# Altium footprint library PCBKU.PcbLib: 192 footprints (part 3 of 12)
Each footprint in its own frame and in the unit in brackets; x right, y up, seen from the top. Pads: shape width x height; smd on the part's side, far side on the other; paste and mask are expansions set on the pad; w line width, h text height; cw(c..) or ccw(c..) is an arc to the next point about the centre after c.
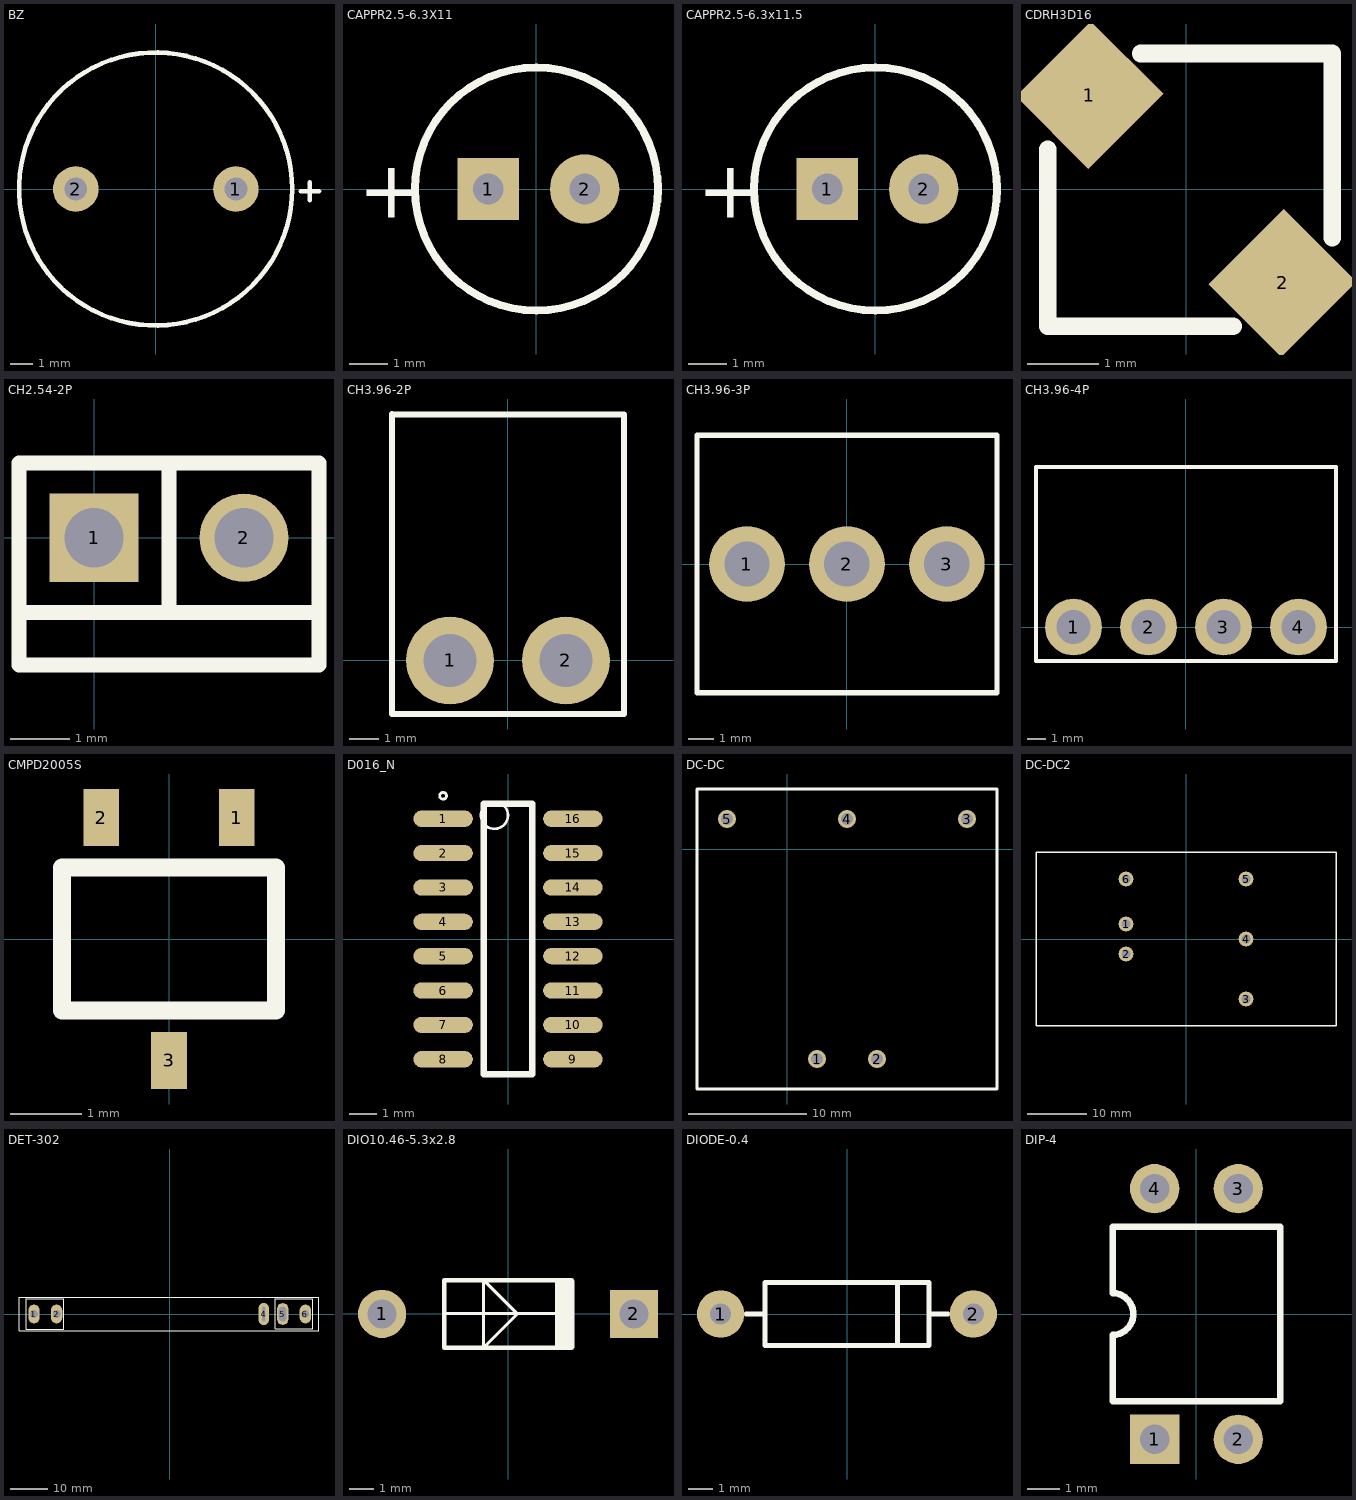
[diagram p2: the footprints below, top view; thin cyan lines are the x and y axes]

## BZ [mm]
pads (2):
  round 2 hole 1: 1(3.518,0) 2(-3.518,0)
Top Overlay:
  circle w0.203: c-0.013,0 r6
  lines w0.2: 6.368,-0.104 7.168,-0.104 ; 6.768,-0.504 6.768,0.296

## CAPPR2.5-6.3X11 [mm]
pads (2):
  rect 1.6x1.6 hole 0.8: 1(-1.25,0)
  round 1.8 hole 0.8: 2(1.25,0)
Top Overlay:
  circle w0.2: c0,0 r3.15
  text "+" at -4.625,-0.75 h1.5
3D body: height 11, standoff -2, extent -3.15,-3.145 3.15,3.145

## CAPPR2.5-6.3x11.5 [mm]
pads (2):
  rect 1.6x1.6 hole 0.8: 1(-1.25,0)
  round 1.8 hole 0.8: 2(1.25,0)
Top Overlay:
  circle w0.2: c0,0 r3.15
  text "+" at -4.625,-0.75 h1.5
3D body: height 11.5, standoff -2, extent -3.15,-3.145 3.15,3.145

## CDRH3D16 [mm]
height 1.1
pads (2):
  rect 1.5x1.45 smd rot 45: 1(-1.359,1.321) 2(1.359,-1.321)
Top Overlay:
  lines w0.25: -1.943,0.559 -1.943,-1.93 0.66,-1.93 ; -0.635,1.905 2.057,1.905 2.057,-0.686

## CH2.54-2P [mm]
pads (2):
  rect 1.5x1.5 hole 1: 1(0,0)
  round 1.5 hole 1: 2(2.54,0)
Top Overlay:
  lines w0.254: -1.27,-1.27 3.81,-1.27 ; 1.27,-1.27 1.27,1.27 ; -1.27,-2.159 3.81,-2.159 3.81,1.27 -1.27,1.27 -1.27,-2.159

## CH3.96-2P [mm]
pads (2):
  round 3 hole 1.8: 1(-1.98,0) 2(1.98,0)
Top Overlay:
  lines w0.203: -3.96,8.407 3.96,8.407 3.96,-1.829 -3.96,-1.829 -3.96,8.421

## CH3.96-3P [mm]
pads (3):
  round 3 hole 1.8: 1(-3.96,0) 2(0,0) 3(3.96,0)
Top Overlay:
  lines w0.203: 5.94,-5.1 -5.94,-5.1 -5.94,5.1 5.947,5.1 5.947,-5.1

## CH3.96-4P [mm]
pads (4):
  round 3 hole 1.8: 1(-5.94,0) 2(-1.98,0) 3(1.98,0) 4(5.94,0)
Top Overlay:
  lines w0.203: -7.92,8.447 -7.92,-1.803 7.92,-1.803 7.92,8.407 ; -7.92,8.458 7.92,8.458

## CMPD2005S [mm]
pads (3):
  rect 0.5x0.8 smd: 1(0.95,1.7) 2(-0.95,1.7) 3(0,-1.7)
Top Overlay:
  lines w0.254: -1.5,-1 1.5,-1 1.5,1 -1.5,1 -1.5,-1

## D016_N [mm]
height 1.1
pads (16):
  oval 2.2x0.6 smd: 1(-2.4,4.445) 2(-2.4,3.175) 3(-2.4,1.905) 4(-2.4,0.635) 5(-2.4,-0.635) 6(-2.4,-1.905) 7(-2.4,-3.175) 8(-2.4,-4.445) 9(2.4,-4.445) 10(2.4,-3.175) 11(2.4,-1.905) 12(2.4,-0.635) 13(2.4,0.635) 14(2.4,1.905) 15(2.4,3.175) 16(2.4,4.445)
Top Overlay:
  circle w0.1: c-0.5,4.572 r0.5
  circle w0.1: c-2.4,5.295 r0.125
  lines w0.25: -0.9,-5 0.9,-5 0.9,5 -0.9,5 -0.9,-5

## DC-DC [mil]
pads (5):
  round 60 hole 40: 1(100,-700) 2(300,-700) 3(600,100) 4(200,100) 5(-200,100)
Top Overlay:
  lines w10: -300,-800 -300,200 700,200 700,-800 -300,-800

## DC-DC2 [mm]
pads (6):
  round 2.5 hole 1.5: 1(-10.16,2.54) 2(-10.16,-2.54) 3(10.16,-10.16) 4(10.16,0) 5(10.16,10.16) 6(-10.16,10.16)
Top Overlay:
  lines w0.254: -25.4,-14.7 -25.4,14.7 25.4,14.7 25.4,-14.7 -25.4,-14.7

## DET-302 [mm]
height 1.1
pads (5):
  oval 3x5 hole 2: 1(-36,0) 2(-30,0) 6(36,0)
  oval 2.8x5.8 hole 0.8 slot 3.8 at 90 deg: 4(24.975,0)
  oval 3x5.8 hole 2 slot 3.8 at 90 deg: 5(30,0)
Top Overlay:
  lines w0.2: -38.045,-4 -38.045,4 -28.045,4 -28.045,-4 -38.045,-4 ; 27.995,-3.975 37.995,-3.975 37.995,4.025 27.995,4.025 27.995,-3.975
  lines w0.254: -39.98,-4.5 -39.98,4.5 39.624,4.5 39.624,-4.5 -39.98,-4.5

## DIO10.46-5.3x2.8 [mm]
height 1.1
pads (2):
  round 2 hole 1.2: 1(-5.23,0)
  rect 2x2 hole 1.2: 2(5.23,0)
Top Overlay:
  rectangle: 1.954,-1.404 2.754,1.396
  lines w0.127: -2.65,0.011 2.668,0.011 ; -1.015,-1.386 -1.015,-1.4 ; -1.015,-1.4 -1.015,1.4 -1.007,1.4 0.382,0.011 0.382,-0.003 -1.015,-1.4
  lines w0.2: 2.65,-1.4 -2.65,-1.4 -2.65,1.4 2.65,1.4

## DIODE-0.4 [mm]
pads (2):
  round 1.9 hole 0.85: 1(-5.08,0) 2(5.08,0)
Top Overlay:
  lines w0.2: -4.064,0 -3.302,0 ; 2.032,-1.27 2.032,1.27 ; 3.302,0 4.064,0 ; -3.302,-1.27 -3.302,1.27 3.302,1.27 3.302,-1.27 -3.302,-1.27
3D body: height 2, standoff -3.3, extent -5.53,-1.3 5.53,1.3

## DIP-4 [mm]
pads (4):
  rect 1.5x1.5 hole 0.9: 1(-1.27,-3.81)
  round 1.5 hole 0.9: 2(1.27,-3.81) 3(1.27,3.81) 4(-1.27,3.81)
Top Overlay:
  lines w0.2: -2.55,-2.65 2.55,-2.65 2.55,2.65 -2.55,2.65 -2.55,0.635 cw(c-2.55,0) -2.55,-0.635 -2.55,-2.65
3D body: height 3.8, standoff -3.5, extent -2.269,-3.986 2.311,3.884